# Altium integrated library Integrated_Library - 02.02.25 - 22.49.IntLib: 792 symbols (part 9 of 11)
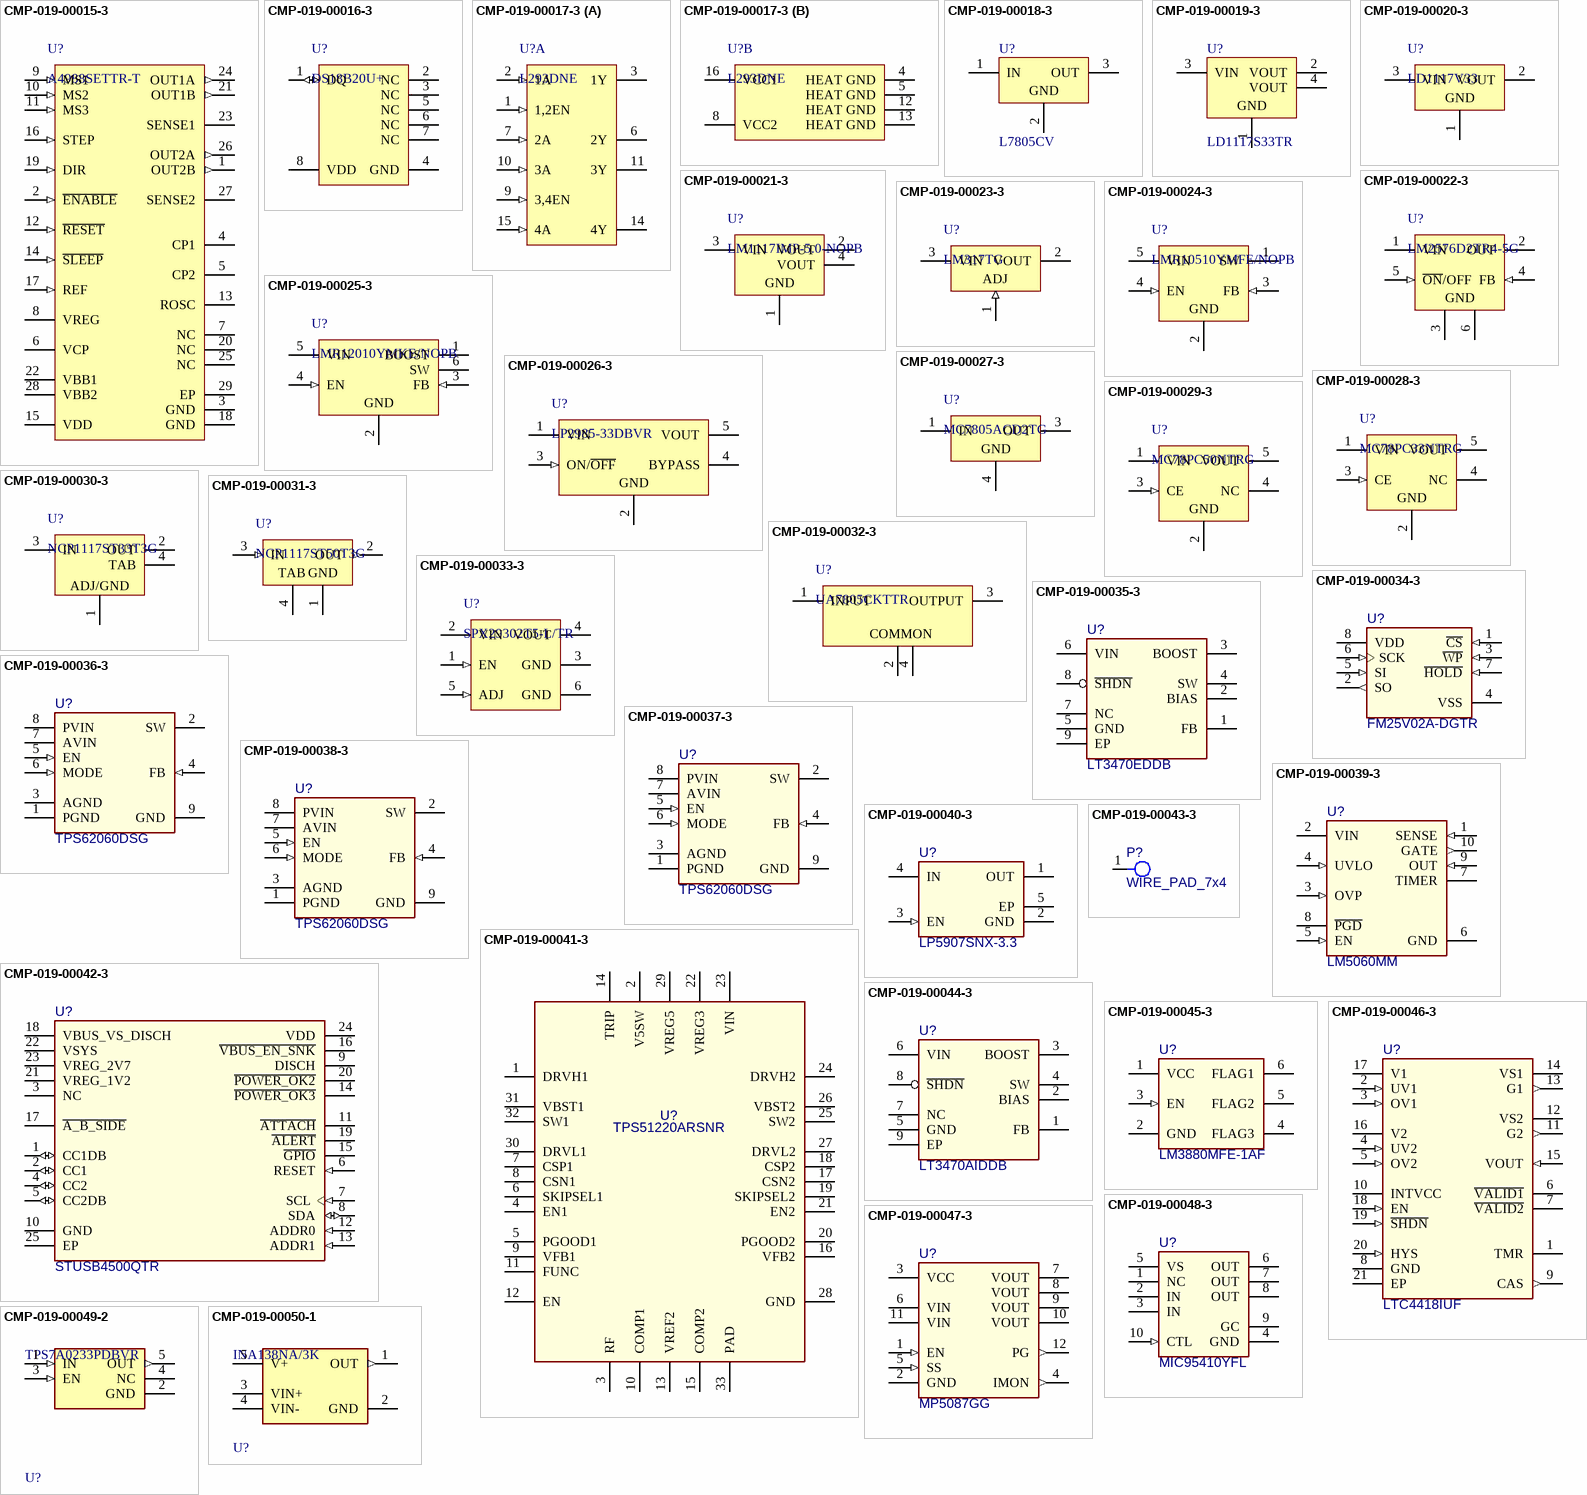
[diagram p34: symbols CMP-019-00015-3 to CMP-019-00050-1]

## CMP-019-00037-3
designator U?, comment TPS62060DSG
Step Down Converter, 3 MHz, 1.6 A, -45 to 85 degC, 8-Pin WSON, RoHS, Tape and Reel; Pins: 9
footprint DSG0008A_V (SON, 8-Leads, Body 2x2mm, Pitch 0.5mm, Thermal Pad 1.6x0.9mm, TI Recommended)
footprint DSG0008A_V (SON, 8-Leads, Body 2x2mm, Pitch 0.5mm, Thermal Pad 1.6x0.9mm, TI Recommended)
pins: 1 PGND (power) "GND supply pin for the output stage.", 2 SW (power) "This is the switch pin and is connected to the internal MOSFET switches. Connect the external inductor between this terminal and the output capacitor.", 3 AGND (power) "Analog GND supply pin for the control circuit.", 4 FB (in) "Feedback pin for the internal regulation loop. Connect the external resistor divider to this pin. In case of fixed output voltage option, connect this pin directly to the output capacitor", 5 EN (in) "This is the enable pin of the device. Pulling this pin to low forces the device into shutdown mode. Pulling this pin to high enables the device. This pin must be terminated", 6 MODE (in) "MODE: MODE pin = high forces the device to operate in fixed frequency PWM mode. MODE pin = low enables the Power Save Mode with automatic transition from PFM mode to fixed frequency PWM mode.", 7 AVIN (power) "Analog VIN power supply for the control circuit. Need to be connected to PVIN and input capacitor.", 8 PVIN (power) "VIN power supply pin for the output stage.", 9 GND (power) "For good thermal performance, this PAD must be soldered to the land pattern on the pcb. This PAD should be used as device GND."

## CMP-019-00038-3
designator U?, comment TPS62060DSG
Step Down Converter, 3 MHz, 1.6 A, -45 to 85 degC, 8-Pin WSON, RoHS, Tape and Reel; Pins: 9
footprint DSG0008A_V (SON, 8-Leads, Body 2x2mm, Pitch 0.5mm, Thermal Pad 1.6x0.9mm, TI Recommended)
footprint DSG0008A_V (SON, 8-Leads, Body 2x2mm, Pitch 0.5mm, Thermal Pad 1.6x0.9mm, TI Recommended)
pins: 1 PGND (power) "GND supply pin for the output stage.", 2 SW (power) "This is the switch pin and is connected to the internal MOSFET switches. Connect the external inductor between this terminal and the output capacitor.", 3 AGND (power) "Analog GND supply pin for the control circuit.", 4 FB (in) "Feedback pin for the internal regulation loop. Connect the external resistor divider to this pin. In case of fixed output voltage option, connect this pin directly to the output capacitor", 5 EN (in) "This is the enable pin of the device. Pulling this pin to low forces the device into shutdown mode. Pulling this pin to high enables the device. This pin must be terminated", 6 MODE (in) "MODE: MODE pin = high forces the device to operate in fixed frequency PWM mode. MODE pin = low enables the Power Save Mode with automatic transition from PFM mode to fixed frequency PWM mode.", 7 AVIN (power) "Analog VIN power supply for the control circuit. Need to be connected to PVIN and input capacitor.", 8 PVIN (power) "VIN power supply pin for the output stage.", 9 GND (power) "For good thermal performance, this PAD must be soldered to the land pattern on the pcb. This PAD should be used as device GND."

## CMP-019-00039-3
designator U?, comment LM5060MM
High-Side Protection Controller with Low Quiescent Current, 5.5 to 65 V, -40 to 125 degC, 10-Pin VSSOP, RoHS, Tape and Reel; Min Supply Voltage: 5.5V; Max Supply Voltage: 65V; Pins: 10; Max Operating Temperature: 125°C; Min Operating Temperature: -40°C
footprint DGS0010A_N (SOP, 10-Leads, Body 3.1x3.1mm, Pitch 0.5mm, IPC Medium Density)
footprint DGS0010A_N (SOP, 10-Leads, Body 3.1x3.1mm, Pitch 0.5mm, IPC Medium Density)
pins: 1 SENSE (in), 2 VIN (power), 3 OVP (in), 4 UVLO (in), 5 EN (in), 6 GND (power), 7 TIMER, 8 ~{PGD} (oc), 9 OUT (in), 10 GATE (out)

## CMP-019-00040-3
designator U?, comment LP5907SNX-3.3
Ultra-Low-Noise, Low-IQ LDO, 3.3 V, 0.25 A, -40 to 125 degC, 4-Pin X2SON, RoHS, Tape and Reel; Output Voltage: 3.3V; Pins: 5; Max Operating Temperature: 125°C; Min Operating Temperature: -40°C
footprint TI-DQN4-480X480TP_V (SON, 4-Leads, Body 1x1mm, Pitch 0.65mm, Thermal Pad 0.5x0.5mm)
footprint TI-DQN4-480X480TP_V (SON, 4-Leads, Body 1x1mm, Pitch 0.65mm, Thermal Pad 0.5x0.5mm)
pins: 1 OUT (power) "Output voltage. A 1-uF Low ESR capacitor should be connected to this pin. Connect this output to the load circuit. An internal 280 Ohm discharge resistor prevents a charge remaining on VOUT when VEN is low.", 2 GND (power) "Common ground", 3 EN (in) "Enable input", 4 IN (power) "Input voltage supply. A 1-µF capacitor should be connected at this input.", 5 EP (power) "Thermal pad for X2SON package, connect to GND or Floating"

## CMP-019-00041-3
designator U?, comment TPS51220ARSNR
Fixed Frequency, 99% Duty Cycle Peak Current Mode Notebook System Power Controller; Output Voltage: 12V; Max Supply Voltage: 32V; Min Operating Temperature: -40°C; Max Operating Temperature: 85°C; Pins: 33
footprint RSN0032B (Texas Instruments)
footprint RSN0032B (Texas Instruments)
pins: 1 DRVH1, 2 V5SW, 3 RF, 4 EN1, 5 PGOOD1, 6 SKIPSEL1, 7 CSP1, 8 CSN1, 9 VFB1, 10 COMP1, 11 FUNC, 12 EN, 13 VREF2, 14 TRIP, 15 COMP2, 16 VFB2, 17 CSN2, 18 CSP2, 19 SKIPSEL2, 20 PGOOD2, 21 EN2, 22 VREG3, 23 VIN, 24 DRVH2, 25 SW2, 26 VBST2, 27 DRVL2, 28 GND, 29 VREG5, 30 DRVL1, 31 VBST1, 32 SW1, 33 PAD

## CMP-019-00042-3
designator U?, comment STUSB4500QTR
Standalone USB PD Sink Controller with Short-to-VBUS Protections, 4.1 to 22 V, -45 to 105 degC, 24-Pin QFN, RoHS, Tape and Reel; Pins: 25
footprint STM-QFN-24_V (QFN, 24-Leads, Body 4x4mm, Pitch 0.5mm, Thermal Pad 2.7x2.7mm)
footprint STM-QFN-24_V (QFN, 24-Leads, Body 4x4mm, Pitch 0.5mm, Thermal Pad 2.7x2.7mm)
pins: 1 CC1DB (io) "Dead battery enable on CC1 pin", 2 CC1 (io) "Type-C configuration channel 1", 3 NC, 4 CC2 (io) "Type-C configuration channel 2", 5 CC2DB (io) "Dead battery enable on CC2 pin", 6 RESET (in) "Reset input, active high", 7 SCL (in) "I2C clock input", 8 SDA (io) "I2C data input/output, active low open drain", 9 DISCH (oc) "Internal discharge path or external discharge path enable, active low open drain", 10 GND (power) "Ground", 11 ~{ATTACH} (oc) "Attachment detection, active low open drain", 12 ADDR0 (in) "I²C device address setting", 13 ADDR1 (in) "I²C device address setting", 14 ~{POWER_OK3} (oc) "Power contract flag, active low open drain", 15 ~{GPIO} (oc) "General purpose output, active low open drain", 16 ~{VBUS_EN_SNK} (oc) "VBUS sink power path enable, active low open drain", 17 ~{A_B_SIDE} (oc) "Cable orientation, active low open drain", 18 VBUS_VS_DISCH "VBUS voltage monitoring and discharge path", 19 ~{ALERT} (oc) "I2C interrupt, active low open drain", 20 ~{POWER_OK2} (oc) "Power contract flag, active low open drain", 21 VREG_1V2 (power) "1.2 V internal regulator output", 22 VSYS (power) "Power supply from system", 23 VREG_2V7 (power) "2.7 V internal regulator output", 24 VDD (power) "Power supply from USB power line", 25 EP (power) "Exposed pad is connected to ground"

## CMP-019-00043-3
designator P?, comment WIRE_PAD_7x4  (no BOM)
SMD WIRE PAD 7 x 4 mm; Pins: 1
footprint WIRE_PAD_7x4-Footprint-1
footprint WIRE_PAD_7x4-Footprint-1
pins: 1 H1

## CMP-019-00044-3
designator U?, comment LT3470AIDDB
Micropower Buck Regulator with Integrated Boost and Catch Diode, 8-pin SON (DDB-8), -40 to 85 degC; Output Voltage: 16V; Pins: 9; Min Operating Temperature: -40°C; Max Operating Temperature: 125°C; Case/Package: DFN
footprint LT-DDB-8_V (SON, 8-Leads, Body 3x2mm, Pitch 0.5mm, Thermal Pad 2.2x0.61mm)
footprint LT-DDB-8_V (SON, 8-Leads, Body 3x2mm, Pitch 0.5mm, Thermal Pad 2.2x0.61mm)
pins: 1 FB "The LT3470X regulates its feedback pin to 1.25V. Connect the feedback resistor divider tap to this pin. Set the output voltage according to VOUT = 1.25V (1 + R1/R2) or R1 = R2 (VOUT/1.25 - 1).", 2 BIAS (power) "The BIAS pin connects to the internal boost Schottky diode and to the internal regulator. Tie to VOUT when VOUT > 2.5V or to VIN otherwise. When VBIAS > 3V the BIAS pin will supply current to the internal regulator.", 3 BOOST "The BOOST pin is used to provide a drive voltage, which is higher than the input voltage, to the internal bipolar NPN power switch.", 4 SW (power) "The SW pin is the output of the internal power switch. Connect this pin to the inductor, catch diode and boost capacitor.", 5 GND "This pin can be left floating, connected to VIN, or tied to GND.", 6 VIN (power) "The VIN pin supplies current to the LT3470X’s internal regulator and to the internal power switch. This pin must be locally bypassed.", 7 NC "This pin can be left floating, connected to VIN, or tied to GND.", 8 ~{SHDN} "The S\H\D\N\ pin is used to put the LT3470X in shutdown mode. Tie to ground to shut down the LT3470A. Apply 2V or more for normal operation. If the shutdown feature is not used, tie this pin to the VIN pin.", 9 EP "This pin can be left floating, connected to VIN, or tied to GND."

## CMP-019-00045-3
designator U?, comment LM3880MFE-1AF
Power Sequencer, 6-pin SOT-23, 250 Reel; RoHS Compliant: Y; ComponentLink1Description: Datasheet URL; ComponentLink1URL: http://www.ti.com/general/docs/lit/getliterature.tsp?genericPartNumber=LM3880&fileType=pdf; Pins: 6
footprint DBV0006A_N (SOT23, 6-Leads, Body 3.05x1.75mm, Pitch 0.95mm, IPC Medium Density)
footprint DBV0006A_N (SOT23, 6-Leads, Body 3.05x1.75mm, Pitch 0.95mm, IPC Medium Density)
pins: 1 VCC (power), 2 GND (power), 3 EN (in), 4 FLAG3 (oc), 5 FLAG2 (oc), 6 FLAG1 (oc)

## CMP-019-00046-3
designator U?, comment LTC4418IUF
Prioritized 2:1 PowerPath™ Controller, 2.5 to 40 V, -40 to 85 degC, 20-Pin QFN, RoHS; Pins: 21
footprint ADI-UF-20_V (SMD, 20-Leads, Body 4x4mm, Pitch 0.5mm)
footprint ADI-UF-20_V (SMD, 20-Leads, Body 4x4mm, Pitch 0.5mm)
pins: 1 TMR, 2 UV1 (in), 3 OV1 (in), 4 UV2 (in), 5 OV2 (in), 6 ~{VALID1} (oc), 7 ~{VALID2} (oc), 8 GND (power), 9 CAS (out), 10 INTVCC, 11 G2 (out), 12 VS2, 13 G1 (out), 14 VS1, 15 VOUT (in), 16 V2 (power), 17 V1 (power), 18 EN (in), 19 ~{SHDN} (in), 20 HYS (in), 21 EP (power)

## CMP-019-00047-3
designator U?, comment MP5087GG
Low RDSON Load Switch with Current Monitoring, 5.5 V, 7 A, -40 to 125 degC, 12-Pin QFN, RoHS; Mounting Technology: SMT; Pins: 12
footprint MPS-QFN-12_V (QFN, 12-Leads, Body 2x2mm, Pitch 0.4mm)
footprint MPS-QFN-12_V (QFN, 12-Leads, Body 2x2mm, Pitch 0.4mm)
pins: 1 EN (in), 2 GND (power), 3 VCC (power), 4 IMON (out), 5 SS (in), 6 VIN, 7 VOUT, 8 VOUT, 9 VOUT, 10 VOUT, 11 VIN, 12 PG (out)

## CMP-019-00048-3
designator U?, comment MIC95410YFL
High Side Load Switch, 2.7 to 9 V, 7 A, 6.6 mOhm, -40 to 125 degC, 10-Pin QFN, RoHS; Pins: 10; Mounting Technology: SMT
footprint MCHP-QFN-10_V (QFN, 10-Leads, Body 1.2x2mm, Pitch 0.5mm)
footprint MCHP-QFN-10_V (QFN, 10-Leads, Body 1.2x2mm, Pitch 0.5mm)
pins: 1 NC, 2 IN, 3 IN, 4 GND (power), 5 VS (power), 6 OUT, 7 OUT, 8 OUT, 9 GC, 10 CTL (in)

## CMP-019-00049-2
designator U?, comment TPS7A0233PDBVR
Fixed Positive LDO Regulator, 3.3V, 0.31V Dropout, PDSO5; RoHS Compliant: Yes
footprint FP-DBV0005A-MFG
footprint FP-DBV0005A-IPC_C
footprint FP-DBV0005A-IPC_B
footprint FP-DBV0005A-IPC_A
pins: 1 IN (in), 2 GND (power), 3 EN (in), 4 NC, 5 OUT (out)

## CMP-019-00050-1
designator U?, comment INA138NA/3K
Operational Amplifier, 1 Func, PDSO5; Package Equivalence Code: TSOP5/6,.11,37; Throw Configuration: POWER SUPPLY SUPPORT CIRCUIT; Package Body Material: Plastic; Max Supply Voltage: 36V; Number of Channels: 1; Qualification Status: Not Qualified; Nominal Supply Voltage: 5V; Min Supply Voltage: 2.7V; Adjustable Threshold: No; Power Supplies: 3/36V; Supply Current-Max (Isup): 45uA; Temperature Grade: AUTOMOTIVE; JESD-609 Code: e4; Package Style: SMALL OUTLINE, LOW PROFILE, SHRINK PITCHMeter; JESD-30 Code: R-PDSO-G5; Height - Seated (Max): 1.45mm; Surface Mount: Yes; Pins: 5; Width: 1.6mm; RoHS Compliant: Yes; Moisture Sensitivity Level: 2; Technology: BICMOS; Terminal Pitch: 0.95mm; Case/Package: LSSOP; Length: 2.9mm; Reach SVHC Compliant: Yes; Terminal Form: Gull Wing; Channels: 1; Peak Reflow Temperature (Cel): 260°C; Package Shape: Rectangular; Terminal Position: DUAL; Max Operating Temperature: 125°C; Terminal Finish: Nickel; Min Operating Temperature: -40°C
footprint FP-DBV0005A-IPC_A-9
footprint FP-DBV0005A-MFG-10
footprint FP-DBV0005A-IPC_C-11
footprint FP-DBV0005A-IPC_B-12
pins: 1 OUT (out), 2 GND (power), 3 VIN+ (power), 4 VIN- (power), 5 V+ (power)

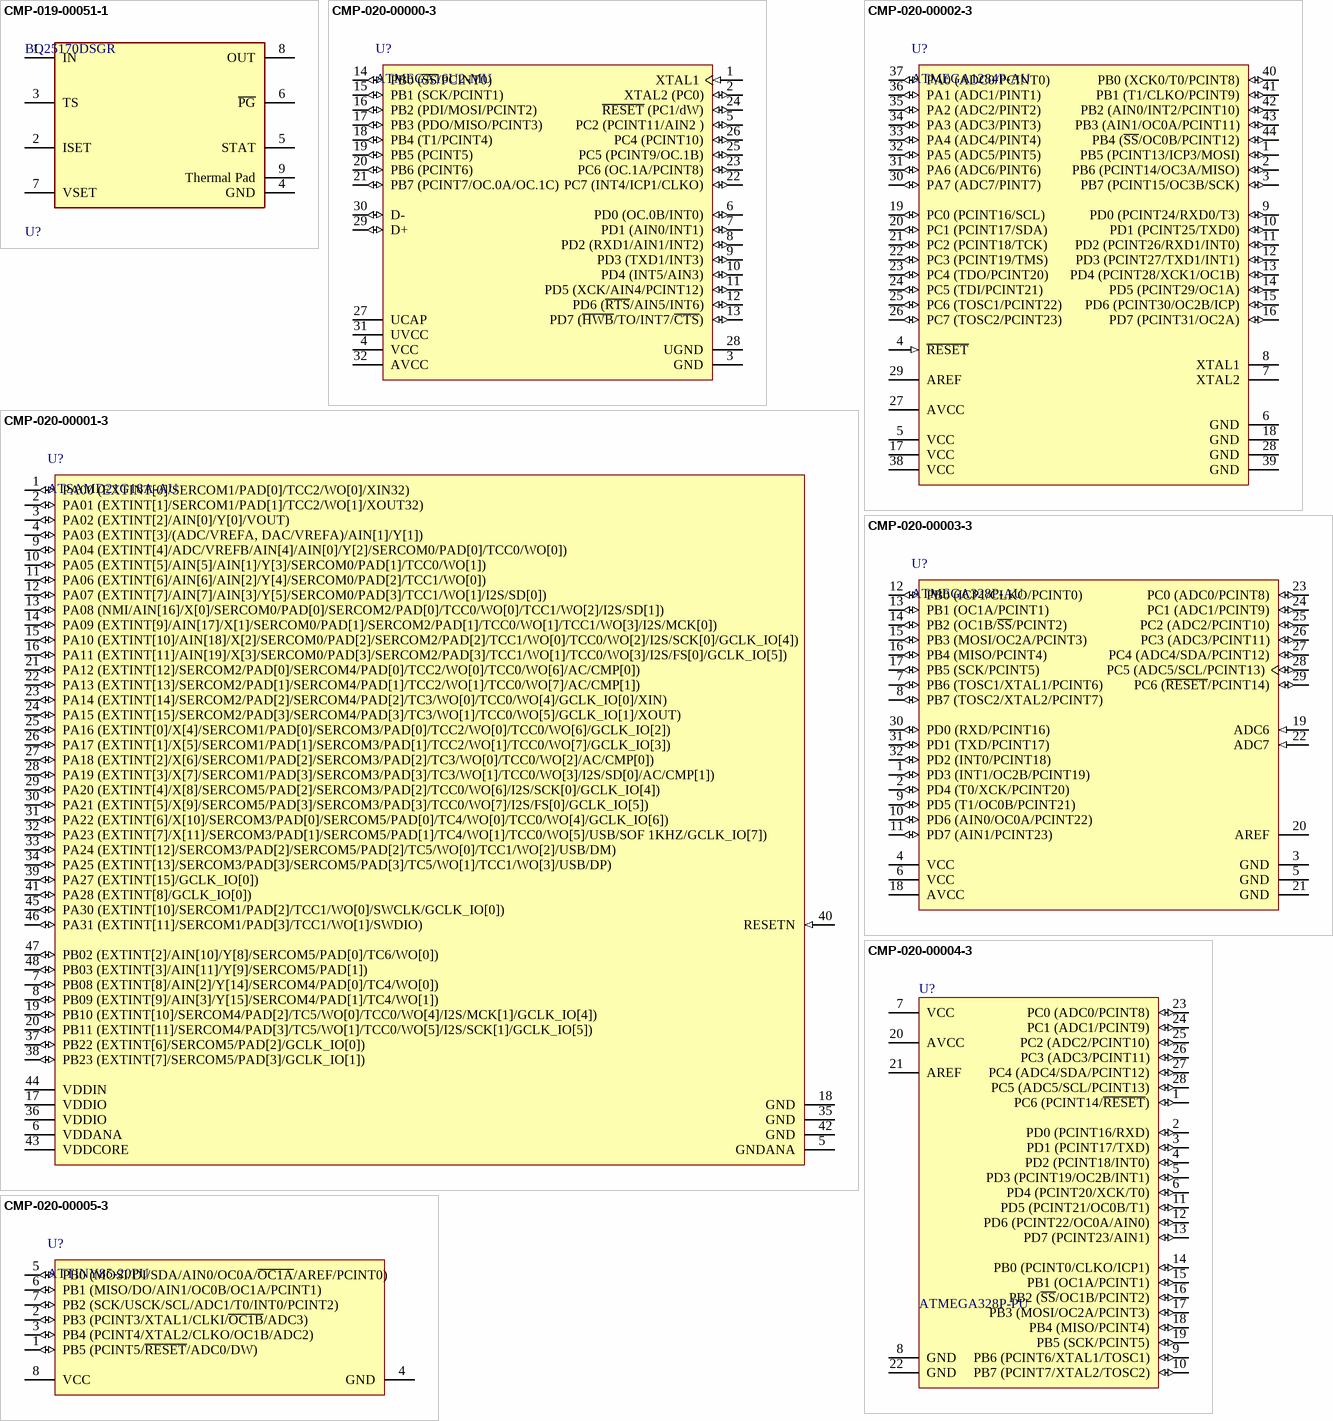
[diagram p20: symbols CMP-019-00051-1 to CMP-020-00005-3]

## CMP-019-00051-1
designator U?, comment BQ25170DSGR
Power Supply Support Circuit, Adjustable, 1 Channel, PDSO8; RoHS Compliant: Yes
footprint FP-DSG0008A-MFG
footprint FP-DSG0008A-IPC_A
footprint FP-DSG0008A-IPC_B
footprint FP-DSG0008A-IPC_C
pins: 1 IN (power), 2 ISET, 3 TS, 4 GND (power), 5 STAT (oc), 6 ~{PG} (oc), 7 VSET, 8 OUT, 9 Thermal Pad (power)

## CMP-020-00000-3
designator U?, comment ATMEGA16U2-MU
8-Bit Microcontroller with ISP Flash and USB Controller, 16 KB, 16 MHz, 2.7 to 5.5 V, -40 to 85 degC, 32-Pin VQFN, RoHS, Tray; Manufacturer: Atmel; Package Version: Rev. N, 01/2015; Max Clock Frequency: 16MHz; I/Os: 22; Density: 16KB; Min Supply Voltage: 2.7V; RAM Size: 1.25KB; Interface: UART; Max Supply Voltage: 5.5V; RoHS Compliant: True; Case/Package: QFN; Max Operating Temperature: 85°C; Package Description: 32-Pin Quad Flat No Lead Package, Body 5 x 5 mm, Pitch 0.5 mm; Min Operating Temperature: -40°C; Mounting Technology: SM; Datasheet Version: Rev. 7799E, 09/2012; Package Reference: QFN32; Package Quantity: 2450; Frequency: 16MHz; Datasheet URL: http://www.atmel.com/Images/doc7799.pdf; Packaging: Tray; Pins: 32; Package URL: http://www.atmel.com/images/atmel-42129-sam-d20_datasheet.pdf; Manufacturer URL: http://www.atmel.com/
footprint ATML-QFN-32_N (QFN, 32-Leads, Body 5.00x5.00mm, Pitch 0.50mm, Thermal Pad 3.60x3.60mm, IPC Medium Density)
footprint ATML-QFN-32_M (QFN, 32-Leads, Body 5x5mm, Pitch 0.5mm, Thermal Pad 3.6x3.6mm, IPC Low Density)
footprint ATML-QFN-32_L (QFN, 32-Leads, Body 5x5mm, Pitch 0.5mm, Thermal Pad 3.6x3.6mm, IPC High Density)
pins: 1 XTAL1 (in) "Input to the inverting Oscillator amplifier and input to the internal clock operating circuit.", 2 XTAL2 (PC0) (io), 3 GND (power) "Ground.", 4 VCC (power) "Digital supply voltage.", 5 PC2 (PCINT11/AIN2 ) (io), 6 PD0 (OC.0B/INT0) (io), 7 PD1 (AIN0/INT1) (io), 8 PD2 (RXD1/AIN1/INT2) (io), 9 PD3 (TXD1/INT3) (io), 10 PD4 (INT5/AIN3) (io), 11 PD5 (XCK/AIN4/PCINT12) (io), 12 PD6 (~{RTS}/AIN5/INT6) (io), 13 PD7 (~{HWB}/TO/INT7/~{CTS}) (io), 14 PB0 (~{SS}/PCINT0) (io), 15 PB1 (SCK/PCINT1) (io), 16 PB2 (PDI/MOSI/PCINT2) (io), 17 PB3 (PDO/MISO/PCINT3) (io), 18 PB4 (T1/PCINT4) (io), 19 PB5 (PCINT5) (io), 20 PB6 (PCINT6) (io), 21 PB7 (PCINT7/OC.0A/OC.1C) (io), 22 PC7 (INT4/ICP1/CLKO) (io), 23 PC6 (OC.1A/PCINT8) (io), 24 ~{RESET} (PC1/dW) (io), 25 PC5 (PCINT9/OC.1B) (io), 26 PC4 (PCINT10) (io), 27 UCAP (power) "USB Pads Internal Regulator Output supply voltage. Should be connected to an external capacitor (1uF).", 28 UGND (power) "USB Ground.", 29 D+ (io) "USB Full Speed Positive Data Upstream Port", 30 D- (io) "USB Full Speed Negative Data Upstream Port", 31 UVCC (power) "USB Pads Internal Regulator Input supply voltage.", 32 AVCC (power) "AVCC is the supply voltage pin (input) for all analog features (Analog Comparator, PLL). It should be externally connected to VCC through a low-pass filter."

## CMP-020-00001-3
designator U?, comment ATSAMD21G18A-AU
SMART ARM-Based Microcontroller, 1.62 to 3.63 V, 256 KB Flash, 32 KB SRAM, -40 to 85 degC, 48-Pin TQFP, RoHS, Tray; Manufacturer: Atmel; Interface: USART; I/Os: 38; Max Supply Voltage: 3.63V; Min Supply Voltage: 1.62V; Density: 256KB; RAM Size: 32KB; Package Reference: TQFP48; Datasheet URL: http://www.atmel.com/images/atmel-42181-sam-d21_datasheet.pdf; Mounting Technology: SM; Datasheet Version: Rev. N, 10/2016; Package Description: 48-Pin Thin Profile Plastic Quad Flat Package, Body 7 x 7 mm, Pitch 0.5 mm; Case/Package: TQFP; Pins: 48; Min Operating Temperature: -40°C; Manufacturer URL: http://www.atmel.com/; Packaging: Tray; Max Operating Temperature: 85°C; RoHS Compliant: True
footprint ATML-TQFP48_M (QFP, 48-Leads, Body 7x7mm, Pitch 0.5mm, IPC Low Density)
footprint ATML-TQFP48_L (QFP, 48-Leads, Body 7x7mm, Pitch 0.5mm, IPC High Density)
footprint ATML-TQFP48_N (QFP, 48-Leads, Body 7x7mm, Pitch 0.5mm, IPC Medium Density)
pins: 1 PA00 (EXTINT[0]/SERCOM1/PAD[0]/TCC2/WO[0]/XIN32) (io), 2 PA01 (EXTINT[1]/SERCOM1/PAD[1]/TCC2/WO[1]/XOUT32) (io), 3 PA02 (EXTINT[2]/AIN[0]/Y[0]/VOUT) (io), 4 PA03 (EXTINT[3]/(ADC/VREFA, DAC/VREFA)/AIN[1]/Y[1]) (io), 5 GNDANA (power) "Ground for the analog power domain", 6 VDDANA (power) "Analog supply voltage", 7 PB08 (EXTINT[8]/AIN[2]/Y[14]/SERCOM4/PAD[0]/TC4/WO[0]) (io), 8 PB09 (EXTINT[9]/AIN[3]/Y[15]/SERCOM4/PAD[1]/TC4/WO[1]) (io), 9 PA04 (EXTINT[4]/ADC/VREFB/AIN[4]/AIN[0]/Y[2]/SERCOM0/PAD[0]/TCC0/WO[0]) (io), 10 PA05 (EXTINT[5]/AIN[5]/AIN[1]/Y[3]/SERCOM0/PAD[1]/TCC0/WO[1]) (io), 11 PA06 (EXTINT[6]/AIN[6]/AIN[2]/Y[4]/SERCOM0/PAD[2]/TCC1/WO[0]) (io), 12 PA07 (EXTINT[7]/AIN[7]/AIN[3]/Y[5]/SERCOM0/PAD[3]/TCC1/WO[1]/I2S/SD[0]) (io), 13 PA08 (NMI/AIN[16]/X[0]/SERCOM0/PAD[0]/SERCOM2/PAD[0]/TCC0/WO[0]/TCC1/WO[2]/I2S/SD[1]) (io), 14 PA09 (EXTINT[9]/AIN[17]/X[1]/SERCOM0/PAD[1]/SERCOM2/PAD[1]/TCC0/WO[1]/TCC1/WO[3]/I2S/MCK[0]) (io), 15 PA10 (EXTINT[10]/AIN[18]/X[2]/SERCOM0/PAD[2]/SERCOM2/PAD[2]/TCC1/WO[0]/TCC0/WO[2]/I2S/SCK[0]/GCLK_IO[4]) (io), 16 PA11 (EXTINT[11]/AIN[19]/X[3]/SERCOM0/PAD[3]/SERCOM2/PAD[3]/TCC1/WO[1]/TCC0/WO[3]/I2S/FS[0]/GCLK_IO[5]) (io), 17 VDDIO (power) "Digital supply voltage", 18 GND (power) "Ground", 19 PB10 (EXTINT[10]/SERCOM4/PAD[2]/TC5/WO[0]/TCC0/WO[4]/I2S/MCK[1]/GCLK_IO[4]) (io), 20 PB11 (EXTINT[11]/SERCOM4/PAD[3]/TC5/WO[1]/TCC0/WO[5]/I2S/SCK[1]/GCLK_IO[5]) (io), 21 PA12 (EXTINT[12]/SERCOM2/PAD[0]/SERCOM4/PAD[0]/TCC2/WO[0]/TCC0/WO[6]/AC/CMP[0]) (io), 22 PA13 (EXTINT[13]/SERCOM2/PAD[1]/SERCOM4/PAD[1]/TCC2/WO[1]/TCC0/WO[7]/AC/CMP[1]) (io), 23 PA14 (EXTINT[14]/SERCOM2/PAD[2]/SERCOM4/PAD[2]/TC3/WO[0]/TCC0/WO[4]/GCLK_IO[0]/XIN) (io), 24 PA15 (EXTINT[15]/SERCOM2/PAD[3]/SERCOM4/PAD[3]/TC3/WO[1]/TCC0/WO[5]/GCLK_IO[1]/XOUT) (io), 25 PA16 (EXTINT[0]/X[4]/SERCOM1/PAD[0]/SERCOM3/PAD[0]/TCC2/WO[0]/TCC0/WO[6]/GCLK_IO[2]) (io), 26 PA17 (EXTINT[1]/X[5]/SERCOM1/PAD[1]/SERCOM3/PAD[1]/TCC2/WO[1]/TCC0/WO[7]/GCLK_IO[3]) (io), 27 PA18 (EXTINT[2]/X[6]/SERCOM1/PAD[2]/SERCOM3/PAD[2]/TC3/WO[0]/TCC0/WO[2]/AC/CMP[0]) (io), 28 PA19 (EXTINT[3]/X[7]/SERCOM1/PAD[3]/SERCOM3/PAD[3]/TC3/WO[1]/TCC0/WO[3]/I2S/SD[0]/AC/CMP[1]) (io), 29 PA20 (EXTINT[4]/X[8]/SERCOM5/PAD[2]/SERCOM3/PAD[2]/TCC0/WO[6]/I2S/SCK[0]/GCLK_IO[4]) (io), 30 PA21 (EXTINT[5]/X[9]/SERCOM5/PAD[3]/SERCOM3/PAD[3]/TCC0/WO[7]/I2S/FS[0]/GCLK_IO[5]) (io), 31 PA22 (EXTINT[6]/X[10]/SERCOM3/PAD[0]/SERCOM5/PAD[0]/TC4/WO[0]/TCC0/WO[4]/GCLK_IO[6]) (io), 32 PA23 (EXTINT[7]/X[11]/SERCOM3/PAD[1]/SERCOM5/PAD[1]/TC4/WO[1]/TCC0/WO[5]/USB/SOF 1KHZ/GCLK_IO[7]) (io), 33 PA24 (EXTINT[12]/SERCOM3/PAD[2]/SERCOM5/PAD[2]/TC5/WO[0]/TCC1/WO[2]/USB/DM) (io), 34 PA25 (EXTINT[13]/SERCOM3/PAD[3]/SERCOM5/PAD[3]/TC5/WO[1]/TCC1/WO[3]/USB/DP) (io), 35 GND (power) "Ground", 36 VDDIO (power) "Digital supply voltage", 37 PB22 (EXTINT[6]/SERCOM5/PAD[2]/GCLK_IO[0]) (io), 38 PB23 (EXTINT[7]/SERCOM5/PAD[3]/GCLK_IO[1]) (io), 39 PA27 (EXTINT[15]/GCLK_IO[0]) (io), 40 RESETN (in) "Reset pin", 41 PA28 (EXTINT[8]/GCLK_IO[0]) (io), 42 GND (power) "Ground", 43 VDDCORE (power) "Core supply voltage / external decoupling pin", 44 VDDIN (power), 45 PA30 (EXTINT[10]/SERCOM1/PAD[2]/TCC1/WO[0]/SWCLK/GCLK_IO[0]) (io), 46 PA31 (EXTINT[11]/SERCOM1/PAD[3]/TCC1/WO[1]/SWDIO) (io), 47 PB02 (EXTINT[2]/AIN[10]/Y[8]/SERCOM5/PAD[0]/TC6/WO[0]) (io), 48 PB03 (EXTINT[3]/AIN[11]/Y[9]/SERCOM5/PAD[1]) (io)

## CMP-020-00002-3
designator U?, comment ATMEGA1284P-AU
8-Bit Microcontroller with 128 KBytes In-System Programmable Flash, 32 I/Os, -40 to 85 degC, 44-Pin TQFP (44A), RoHS, Tray; Manufacturer: Atmel; Density: 128KB; Frequency: 20MHz; RAM Size: 16KB; PWM Channels: 6; USB Channels: 0; I/Os: 32; Min Supply Voltage: 1.8V; Max Supply Voltage: 5.5V; Interface: USART; ADC Channels: 8; Pins: 8; Manufacturer URL: http://www.atmel.com/; Case/Package: TQFP; Max Operating Temperature: 85°C; Package Description: 44-Pin Quad Flat Package, Body 10 x 10 mm, Pitch 0.8 mm; Mounting Technology: SM; Package Reference: 44A; Min Operating Temperature: -40°C; Clock Frequency: 20MHz; Datasheet Version: Rev. 8272G, 01/2015; Package Quantity: 160; Ethernet Channels: 0; Packaging: Tray; Datasheet URL: http://www.atmel.com/images/atmel-8272-8-bit-avr-microcontroller-atmega164a_pa-324a_pa-644a_pa-1284_p_summary.pdf; Max Clock Frequency: 20MHz; RoHS Compliant: True
footprint ATML-44A_L (TQFP, 44-Leads, Body 10x10mm, Pitch 0.8mm, IPC High Density)
footprint ATML-44A_M (TQFP, 44-Leads, Body 10x10mm, Pitch 0.8mm, IPC Low Density)
footprint ATML-44A_N (TQFP, 44-Leads, Body 10x10mm, Pitch 0.8mm, IPC Medium Density)
pins: 1 PB5 (PCINT13/ICP3/MOSI) (io), 2 PB6 (PCINT14/OC3A/MISO) (io), 3 PB7 (PCINT15/OC3B/SCK) (io), 4 ~{RESET} (in) "Reset input.", 5 VCC (power) "Digital supply voltage.", 6 GND (power) "Ground.", 7 XTAL2 "Output from the inverting Oscillator amplifier.", 8 XTAL1 "Input to the inverting Oscillator amplifier and input to the internal clock operating circuit.", 9 PD0 (PCINT24/RXD0/T3) (io), 10 PD1 (PCINT25/TXD0) (io), 11 PD2 (PCINT26/RXD1/INT0) (io), 12 PD3 (PCINT27/TXD1/INT1) (io), 13 PD4 (PCINT28/XCK1/OC1B) (io), 14 PD5 (PCINT29/OC1A) (io), 15 PD6 (PCINT30/OC2B/ICP) (io), 16 PD7 (PCINT31/OC2A) (io), 17 VCC (power) "Digital supply voltage.", 18 GND (power) "Ground.", 19 PC0 (PCINT16/SCL) (io), 20 PC1 (PCINT17/SDA) (io), 21 PC2 (PCINT18/TCK) (io), 22 PC3 (PCINT19/TMS) (io), 23 PC4 (TDO/PCINT20) (io), 24 PC5 (TDI/PCINT21) (io), 25 PC6 (TOSC1/PCINT22) (io), 26 PC7 (TOSC2/PCINT23) (io), 27 AVCC (power) "AVCC is the supply voltage pin for Port A and the Analog-to-digital Converter.", 28 GND (power) "Ground.", 29 AREF "This is the analog reference pin for the Analog-to-digital Converter.", 30 PA7 (ADC7/PINT7) (io), 31 PA6 (ADC6/PINT6) (io), 32 PA5 (ADC5/PINT5) (io), 33 PA4 (ADC4/PINT4) (io), 34 PA3 (ADC3/PINT3) (io), 35 PA2 (ADC2/PINT2) (io), 36 PA1 (ADC1/PINT1) (io), 37 PA0 (ADC0/PCINT0) (io), 38 VCC (power) "Digital supply voltage.", 39 GND (power) "Ground.", 40 PB0 (XCK0/T0/PCINT8) (io), 41 PB1 (T1/CLKO/PCINT9) (io), 42 PB2 (AIN0/INT2/PCINT10) (io), 43 PB3 (AIN1/OC0A/PCINT11) (io), 44 PB4 (~{SS}/OC0B/PCINT12) (io)

## CMP-020-00003-3
designator U?, comment ATMEGA328P-AU
8-Bit Microcontroller with 32 KBytes In-System Programmable Flash, 23 I/Os, -40 to 85 degC, 32-Pin TQFP (32A), RoHS, Tray; Manufacturer: Atmel; PWM Channels: 6; Frequency: 20MHz; RAM Size: 2KB; ADC Channels: 8; Max Supply Voltage: 5.5V; Density: 32KB; USB Channels: 0; I/Os: 23; Min Supply Voltage: 1.8V; Interface: USART; Package Reference: 32A; Package Description: 32-Pin Thin Profile Plastic Quad Flat Package, Body 7 x 7 mm, Pitch 0.8 mm; Max Operating Temperature: 85°C; Mounting Technology: SM; Datasheet URL: http://www.atmel.com/images/Atmel-8271-8-bit-AVR-Microcontroller-ATmega48A-48PA-88A-88PA-168A-168PA-328-328P_datasheet_Complete.pdf; Pins: 32; Packaging: Tray; RoHS Compliant: True; Max Clock Frequency: 20MHz; Ethernet Channels: 0; Clock Frequency: 20MHz; Case/Package: TQFP; Manufacturer URL: http://www.atmel.com/; Datasheet Version: Rev. 8271J, 11/2015; Package Quantity: 250; Min Operating Temperature: -40°C
footprint ATML-32A_M (TQFP, 32-Leads, Body 7x7mm, Pitch 0.8mm, IPC Low Density)
footprint ATML-32A_N (TQFP, 32-Leads, Body 7x7mm, Pitch 0.8mm, IPC Medium Density)
footprint ATML-32A_L (TQFP, 32-Leads, Body 7x7mm, Pitch 0.8mm, IPC High Density)
pins: 1 PD3 (INT1/OC2B/PCINT19) (io), 2 PD4 (T0/XCK/PCINT20) (io), 3 GND (power) "Ground.", 4 VCC (power) "Digital supply voltage.", 5 GND (power) "Ground.", 6 VCC (power) "Digital supply voltage.", 7 PB6 (TOSC1/XTAL1/PCINT6) (io), 8 PB7 (TOSC2/XTAL2/PCINT7) (io), 9 PD5 (T1/OC0B/PCINT21) (io), 10 PD6 (AIN0/OC0A/PCINT22) (io), 11 PD7 (AIN1/PCINT23) (io), 12 PB0 (ICP1/CLKO/PCINT0) (io), 13 PB1 (OC1A/PCINT1) (io), 14 PB2 (OC1B/~{SS}/PCINT2) (io), 15 PB3 (MOSI/OC2A/PCINT3) (io), 16 PB4 (MISO/PCINT4) (io), 17 PB5 (SCK/PCINT5) (io), 18 AVCC (power) "AVCC is the supply voltage pin for the A/D Converter, PC3:0, and ADC7:6. It should be externally connected to VCC, even if the ADC is not used. If the ADC is used, it should be connected to VCC through a low-pass filter. (See Datasheet)", 19 ADC6 (in) "In the TQFP and QFN/MLF package, ADC7:6 serve as analog inputs to the A/D converter.These pins are powered from the analog supply and serve as 10-bit ADC channels.", 20 AREF "AREF is the analog reference pin for the A/D Converter.", 21 GND (power) "Ground.", 22 ADC7 (in) "In the TQFP and QFN/MLF package, ADC7:6 serve as analog inputs to the A/D converter.These pins are powered from the analog supply and serve as 10-bit ADC channels.", 23 PC0 (ADC0/PCINT8) (io), 24 PC1 (ADC1/PCINT9) (io), 25 PC2 (ADC2/PCINT10) (io), 26 PC3 (ADC3/PCINT11) (io), 27 PC4 (ADC4/SDA/PCINT12) (io), 28 PC5 (ADC5/SCL/PCINT13) (io), 29 PC6 (~{RESET}/PCINT14) (io), 30 PD0 (RXD/PCINT16) (io), 31 PD1 (TXD/PCINT17) (io), 32 PD2 (INT0/PCINT18) (io)

## CMP-020-00004-3
designator U?, comment ATMEGA328P-PU
8-Bit Microcontroller with 32 KBytes In-System Programmable Flash, 23 I/Os, -40 to 85 degC, 28-Pin PDIP (28P3), RoHS, Tube; Manufacturer: Atmel; I/Os: 23; Density: 32KB; Package Version: Rev. B, 09/2001; Max Clock Frequency: 20MHz; Interface: USART; Max Supply Voltage: 5.5V; Min Supply Voltage: 1.8V; Ethernet Channels: 0; RAM Size: 2KB; RoHS Compliant: True; Datasheet URL: http://www.atmel.com/images/Atmel-8271-8-bit-AVR-Microcontroller-ATmega48A-48PA-88A-88PA-168A-168PA-328-328P_datasheet_Complete.pdf; Packaging: Rail/Tube; Manufacturer URL: http://www.atmel.com/; Mounting Technology: TH; Package URL: http://www.atmel.com/images/Atmel-8271-8-bit-AVR-Microcontroller-ATmega48A-48PA-88A-88PA-168A-168PA-328-328P_datasheet_Complete.pdf; Datasheet Version: Rev. 8271J, 11/2015; Package Description: 28-Pin Plastic Dual Inline Package, Body 34.671 x 7.3025 mm, Pitch 2.54 mm; Package Quantity: 14; Min Operating Temperature: -40°C; Max Operating Temperature: 85°C; Case/Package: DIP; Pins: 28; Package Reference: 28P3
footprint ATML-28P3 (DIP, 28-Leads, Body 34.8x7.2mm, Pitch 2.54mm)
pins: 1 PC6 (PCINT14/~{RESET}) (io), 2 PD0 (PCINT16/RXD) (io), 3 PD1 (PCINT17/TXD) (io), 4 PD2 (PCINT18/INT0) (io), 5 PD3 (PCINT19/OC2B/INT1) (io), 6 PD4 (PCINT20/XCK/T0) (io), 7 VCC (power), 8 GND (power), 9 PB6 (PCINT6/XTAL1/TOSC1) (io), 10 PB7 (PCINT7/XTAL2/TOSC2) (io), 11 PD5 (PCINT21/OC0B/T1) (io), 12 PD6 (PCINT22/OC0A/AIN0) (io), 13 PD7 (PCINT23/AIN1) (io), 14 PB0 (PCINT0/CLKO/ICP1) (io), 15 PB1 (OC1A/PCINT1) (io), 16 PB2 (~{SS}/OC1B/PCINT2) (io), 17 PB3 (MOSI/OC2A/PCINT3) (io), 18 PB4 (MISO/PCINT4) (io), 19 PB5 (SCK/PCINT5) (io), 20 AVCC (power), 21 AREF (power), 22 GND (power), 23 PC0 (ADC0/PCINT8) (io), 24 PC1 (ADC1/PCINT9) (io), 25 PC2 (ADC2/PCINT10) (io), 26 PC3 (ADC3/PCINT11) (io), 27 PC4 (ADC4/SDA/PCINT12) (io), 28 PC5 (ADC5/SCL/PCINT13) (io)

## CMP-020-00005-3
designator U?, comment ATTINY85-20PU
8-bit AVR(R) Microcontroller with 8 KBytes In-System Programmable Flash, 2.7 to 5.5 V, -40 to 85 degC, 8-Pin DIP, Pb-Free; Manufacturer: Atmel; Frequency: 20MHz; Max Supply Voltage: 5.5V; Density: 8KB; UART Channels: 1; USB Channels: 0; I/Os: 6; RAM Size: 512B; Interface: SPI; ADC Channels: 4; Min Supply Voltage: 2.7V; Package Version: Rev. E, 07/2014; Max Operating Temperature: 85°C; Package Description: 8-Pin Plastic Dual Inline Package, Body 9.271 x 6.35 mm, Pitch 2.54 mm; Pins: 8; Min Operating Temperature: -40°C; Manufacturer URL: http://www.atmel.com/; Packaging: Rail/Tube; Package Quantity: 50; Datasheet Version: Rev. 2586K, 01/2008; Max Clock Frequency: 20MHz; Package URL: http://www.atmel.com/Images/doc2535.pdf; PWM Channels: 6; Datasheet URL: https://datasheet.ciiva.com/20168/73-5122-20168321.pdf; Mounting Technology: TH; RoHS Compliant: True; Package Reference: 8P3; Case/Package: DIP
footprint ATML-8P3 (DIP, 8-Leads, Body 10.15x7.1mm, Pitch 2.54mm)
pins: 1 PB5 (PCINT5/~{RESET}/ADC0/DW) (io), 2 PB3 (PCINT3/XTAL1/CLKI/~{OC1B}/ADC3) (io), 3 PB4 (PCINT4/XTAL2/CLKO/OC1B/ADC2) (io), 4 GND (power), 5 PB0 (MOSI/DI/SDA/AIN0/OC0A/~{OC1A}/AREF/PCINT0) (io), 6 PB1 (MISO/DO/AIN1/OC0B/OC1A/PCINT1) (io), 7 PB2 (SCK/USCK/SCL/ADC1/T0/INT0/PCINT2) (io), 8 VCC (power)
